# Altium footprint library CONN_HDR_1.27MM_ST.PcbLib: 116 footprints (part 8 of 9) (continued)
## HDRMINI_M_2X10 [mm] "mini header (50mil pitch)" (continued)
3D body: height 7.3, standoff -2.5, extent -3.375,-0.835 -2.975,-0.435
3D body: height 2.8, standoff 0, extent -2.54,0 -1.27,1.27
3D body: height 7.3, standoff -2.5, extent -2.105,0.435 -1.705,0.835
3D body: height 2.8, standoff 0, extent -3.81,0 -2.54,1.27
3D body: height 7.3, standoff -2.5, extent -3.375,0.435 -2.975,0.835
3D body: height 2.8, standoff 0, extent -5.08,-1.27 -3.81,0
3D body: height 7.3, standoff -2.5, extent -4.645,-0.835 -4.245,-0.435
3D body: height 2.8, standoff 0, extent -6.35,-1.27 -5.08,0
3D body: height 7.3, standoff -2.5, extent -5.915,-0.835 -5.515,-0.435
3D body: height 2.8, standoff 0, extent -5.08,0 -3.81,1.27
3D body: height 7.3, standoff -2.5, extent -4.645,0.435 -4.245,0.835
3D body: height 2.8, standoff 0, extent -6.35,0 -5.08,1.27
3D body: height 7.3, standoff -2.5, extent -5.915,0.435 -5.515,0.835

## HDRMINI_M_2X11 [mm] "mini header (50mil pitch)"
pads (22):
  round 1 hole 0.7 mask+0.05: 1(-6.35,-0.635) 2(-6.35,0.635) 3(-5.08,-0.635) 4(-5.08,0.635) 5(-3.81,-0.635) 6(-3.81,0.635) 7(-2.54,-0.635) 8(-2.54,0.635) 9(-1.27,-0.635) 10(-1.27,0.635) 11(0,-0.635) 12(0,0.635) 13(1.27,-0.635) 14(1.27,0.635) 15(2.54,-0.635) 16(2.54,0.635) 17(3.81,-0.635) 18(3.81,0.635) 19(5.08,-0.635) 20(5.08,0.635) 21(6.35,-0.635) 22(6.35,0.635)
Top Overlay:
  circle w0.2: c-7.493,-0.635 r0.2
  lines w0.2: -6.886,-0.035 -6.985,-0.2 -6.985,-1.27 -6.886,-1.435 -5.814,-1.435 -5.715,-1.27 -5.616,-1.435 -4.544,-1.435 -4.445,-1.27 -4.346,-1.435 -3.274,-1.435 -3.175,-1.27 -3.076,-1.435 -2.004,-1.435 -1.905,-1.27 -1.806,-1.435 -0.734,-1.435 -0.635,-1.27 -0.536,-1.435 0.536,-1.435 0.635,-1.27 0.734,-1.435 1.806,-1.435 1.905,-1.27 2.004,-1.435 3.076,-1.435 3.175,-1.27 3.274,-1.435 4.346,-1.435 4.445,-1.27 4.544,-1.435 5.616,-1.435 5.715,-1.27 5.814,-1.435 6.886,-1.435 6.985,-1.27 6.985,-0.2 6.886,-0.035 ; -6.886,0.035 -6.985,0.2 -6.985,1.27 -6.886,1.435 -5.814,1.435 -5.715,1.27 -5.616,1.435 -4.544,1.435 -4.445,1.27 -4.346,1.435 -3.274,1.435 -3.175,1.27 -3.076,1.435 -2.004,1.435 -1.905,1.27 -1.806,1.435 -0.734,1.435 -0.635,1.27 -0.536,1.435 0.536,1.435 0.635,1.27 0.734,1.435 1.806,1.435 1.905,1.27 2.004,1.435 3.076,1.435 3.175,1.27 3.274,1.435 4.346,1.435 4.445,1.27 4.544,1.435 5.616,1.435 5.715,1.27 5.814,1.435 6.886,1.435 6.985,1.27 6.985,0.2 6.886,0.035
3D body: height 7.3, standoff -2.5, extent -6.55,0.435 -6.15,0.835
3D body: height 2.8, standoff 0, extent -6.985,0 -5.715,1.27
3D body: height 7.3, standoff -2.5, extent -5.28,0.435 -4.88,0.835
3D body: height 2.8, standoff 0, extent -5.715,0 -4.445,1.27
3D body: height 7.3, standoff -2.5, extent -6.55,-0.835 -6.15,-0.435
3D body: height 2.8, standoff 0, extent -6.985,-1.27 -5.715,0
3D body: height 7.3, standoff -2.5, extent -5.28,-0.835 -4.88,-0.435
3D body: height 2.8, standoff 0, extent -5.715,-1.27 -4.445,0
3D body: height 7.3, standoff -2.5, extent -4.01,0.435 -3.61,0.835
3D body: height 2.8, standoff 0, extent -4.445,0 -3.175,1.27
3D body: height 7.3, standoff -2.5, extent -2.74,0.435 -2.34,0.835
3D body: height 2.8, standoff 0, extent -3.175,0 -1.905,1.27
3D body: height 7.3, standoff -2.5, extent -4.01,-0.835 -3.61,-0.435
3D body: height 2.8, standoff 0, extent -4.445,-1.27 -3.175,0
3D body: height 7.3, standoff -2.5, extent -2.74,-0.835 -2.34,-0.435
3D body: height 2.8, standoff 0, extent -3.175,-1.27 -1.905,0
3D body: height 7.3, standoff -2.5, extent -1.47,0.435 -1.07,0.835
3D body: height 2.8, standoff 0, extent -1.905,0 -0.635,1.27
3D body: height 7.3, standoff -2.5, extent -0.2,0.435 0.2,0.835
3D body: height 2.8, standoff 0, extent -0.635,0 0.635,1.27
3D body: height 7.3, standoff -2.5, extent -1.47,-0.835 -1.07,-0.435
3D body: height 2.8, standoff 0, extent -1.905,-1.27 -0.635,0
3D body: height 7.3, standoff -2.5, extent -0.2,-0.835 0.2,-0.435
3D body: height 2.8, standoff 0, extent -0.635,-1.27 0.635,0
3D body: height 7.3, standoff -2.5, extent 1.07,0.435 1.47,0.835
3D body: height 2.8, standoff 0, extent 0.635,0 1.905,1.27
3D body: height 7.3, standoff -2.5, extent 2.34,0.435 2.74,0.835
3D body: height 2.8, standoff 0, extent 1.905,0 3.175,1.27
3D body: height 7.3, standoff -2.5, extent 1.07,-0.835 1.47,-0.435
3D body: height 2.8, standoff 0, extent 0.635,-1.27 1.905,0
3D body: height 7.3, standoff -2.5, extent 2.34,-0.835 2.74,-0.435
3D body: height 2.8, standoff 0, extent 1.905,-1.27 3.175,0
3D body: height 7.3, standoff -2.5, extent 3.61,0.435 4.01,0.835
3D body: height 2.8, standoff 0, extent 3.175,0 4.445,1.27
3D body: height 7.3, standoff -2.5, extent 4.88,0.435 5.28,0.835
3D body: height 2.8, standoff 0, extent 4.445,0 5.715,1.27
3D body: height 7.3, standoff -2.5, extent 3.61,-0.835 4.01,-0.435
3D body: height 2.8, standoff 0, extent 3.175,-1.27 4.445,0
3D body: height 7.3, standoff -2.5, extent 4.88,-0.835 5.28,-0.435
3D body: height 2.8, standoff 0, extent 4.445,-1.27 5.715,0
3D body: height 7.3, standoff -2.5, extent 6.15,0.435 6.55,0.835
3D body: height 2.8, standoff 0, extent 5.715,0 6.985,1.27
3D body: height 7.3, standoff -2.5, extent 6.15,-0.835 6.55,-0.435
3D body: height 2.8, standoff 0, extent 5.715,-1.27 6.985,0

## HDRMINI_M_2X12 [mm] "mini header (50mil pitch)"
pads (24):
  round 1 hole 0.7 mask+0.05: 1(-6.985,-0.635) 2(-6.985,0.635) 3(-5.715,-0.635) 4(-5.715,0.635) 5(-4.445,-0.635) 6(-4.445,0.635) 7(-3.175,-0.635) 8(-3.175,0.635) 9(-1.905,-0.635) 10(-1.905,0.635) 11(-0.635,-0.635) 12(-0.635,0.635) 13(0.635,-0.635) 14(0.635,0.635) 15(1.905,-0.635) 16(1.905,0.635) 17(3.175,-0.635) 18(3.175,0.635) 19(4.445,-0.635) 20(4.445,0.635) 21(5.715,-0.635) 22(5.715,0.635) 23(6.985,-0.635) 24(6.985,0.635)
Top Overlay:
  circle w0.2: c-8.128,-0.635 r0.2
  lines w0.2: -7.521,-0.035 -7.62,-0.2 -7.62,-1.27 -7.521,-1.435 -6.449,-1.435 -6.35,-1.27 -6.251,-1.435 -5.179,-1.435 -5.08,-1.27 -4.981,-1.435 -3.909,-1.435 -3.81,-1.27 -3.711,-1.435 -2.639,-1.435 -2.54,-1.27 -2.441,-1.435 -1.369,-1.435 -1.27,-1.27 -1.171,-1.435 -0.099,-1.435 0,-1.27 0.099,-1.435 1.171,-1.435 1.27,-1.27 1.369,-1.435 2.441,-1.435 2.54,-1.27 2.639,-1.435 3.711,-1.435 3.81,-1.27 3.909,-1.435 4.981,-1.435 5.08,-1.27 5.179,-1.435 6.251,-1.435 6.35,-1.27 6.449,-1.435 7.521,-1.435 7.62,-1.27 7.62,-0.2 7.521,-0.035 ; -7.521,0.035 -7.62,0.2 -7.62,1.27 -7.521,1.435 -6.449,1.435 -6.35,1.27 -6.251,1.435 -5.179,1.435 -5.08,1.27 -4.981,1.435 -3.909,1.435 -3.81,1.27 -3.711,1.435 -2.639,1.435 -2.54,1.27 -2.441,1.435 -1.369,1.435 -1.27,1.27 -1.171,1.435 -0.099,1.435 0,1.27 0.099,1.435 1.171,1.435 1.27,1.27 1.369,1.435 2.441,1.435 2.54,1.27 2.639,1.435 3.711,1.435 3.81,1.27 3.909,1.435 4.981,1.435 5.08,1.27 5.179,1.435 6.251,1.435 6.35,1.27 6.449,1.435 7.521,1.435 7.62,1.27 7.62,0.2 7.521,0.035
3D body: height 2.8, standoff 0, extent 6.35,-1.27 7.62,0
3D body: height 7.3, standoff -2.5, extent 6.785,-0.835 7.185,-0.435
3D body: height 2.8, standoff 0, extent 5.08,-1.27 6.35,0
3D body: height 7.3, standoff -2.5, extent 5.515,-0.835 5.915,-0.435
3D body: height 2.8, standoff 0, extent 6.35,0 7.62,1.27
3D body: height 7.3, standoff -2.5, extent 6.785,0.435 7.185,0.835
3D body: height 2.8, standoff 0, extent 5.08,0 6.35,1.27
3D body: height 7.3, standoff -2.5, extent 5.515,0.435 5.915,0.835
3D body: height 2.8, standoff 0, extent 3.81,-1.27 5.08,0
3D body: height 7.3, standoff -2.5, extent 4.245,-0.835 4.645,-0.435
3D body: height 2.8, standoff 0, extent 2.54,-1.27 3.81,0
3D body: height 7.3, standoff -2.5, extent 2.975,-0.835 3.375,-0.435
3D body: height 2.8, standoff 0, extent 3.81,0 5.08,1.27
3D body: height 7.3, standoff -2.5, extent 4.245,0.435 4.645,0.835
3D body: height 2.8, standoff 0, extent 2.54,0 3.81,1.27
3D body: height 7.3, standoff -2.5, extent 2.975,0.435 3.375,0.835
3D body: height 2.8, standoff 0, extent 1.27,-1.27 2.54,0
3D body: height 7.3, standoff -2.5, extent 1.705,-0.835 2.105,-0.435
3D body: height 2.8, standoff 0, extent 0,-1.27 1.27,0
3D body: height 7.3, standoff -2.5, extent 0.435,-0.835 0.835,-0.435
3D body: height 2.8, standoff 0, extent 1.27,0 2.54,1.27
3D body: height 7.3, standoff -2.5, extent 1.705,0.435 2.105,0.835
3D body: height 2.8, standoff 0, extent 0,0 1.27,1.27
3D body: height 7.3, standoff -2.5, extent 0.435,0.435 0.835,0.835
3D body: height 2.8, standoff 0, extent -1.27,-1.27 0,0
3D body: height 7.3, standoff -2.5, extent -0.835,-0.835 -0.435,-0.435
3D body: height 2.8, standoff 0, extent -2.54,-1.27 -1.27,0
3D body: height 7.3, standoff -2.5, extent -2.105,-0.835 -1.705,-0.435
3D body: height 2.8, standoff 0, extent -1.27,0 0,1.27
3D body: height 7.3, standoff -2.5, extent -0.835,0.435 -0.435,0.835
3D body: height 2.8, standoff 0, extent -2.54,0 -1.27,1.27
3D body: height 7.3, standoff -2.5, extent -2.105,0.435 -1.705,0.835
3D body: height 2.8, standoff 0, extent -3.81,-1.27 -2.54,0
3D body: height 7.3, standoff -2.5, extent -3.375,-0.835 -2.975,-0.435
3D body: height 2.8, standoff 0, extent -5.08,-1.27 -3.81,0
3D body: height 7.3, standoff -2.5, extent -4.645,-0.835 -4.245,-0.435
3D body: height 2.8, standoff 0, extent -3.81,0 -2.54,1.27
3D body: height 7.3, standoff -2.5, extent -3.375,0.435 -2.975,0.835
3D body: height 2.8, standoff 0, extent -5.08,0 -3.81,1.27
3D body: height 7.3, standoff -2.5, extent -4.645,0.435 -4.245,0.835
3D body: height 2.8, standoff 0, extent -6.35,-1.27 -5.08,0
3D body: height 7.3, standoff -2.5, extent -5.915,-0.835 -5.515,-0.435
3D body: height 2.8, standoff 0, extent -7.62,-1.27 -6.35,0
3D body: height 7.3, standoff -2.5, extent -7.185,-0.835 -6.785,-0.435
3D body: height 2.8, standoff 0, extent -6.35,0 -5.08,1.27
3D body: height 7.3, standoff -2.5, extent -5.915,0.435 -5.515,0.835
3D body: height 2.8, standoff 0, extent -7.62,0 -6.35,1.27
3D body: height 7.3, standoff -2.5, extent -7.185,0.435 -6.785,0.835

## HDRMINI_M_2X13 [mm] "mini header (50mil pitch)"
pads (26):
  round 1 hole 0.7 mask+0.05: 1(-7.62,-0.635) 2(-7.62,0.635) 3(-6.35,-0.635) 4(-6.35,0.635) 5(-5.08,-0.635) 6(-5.08,0.635) 7(-3.81,-0.635) 8(-3.81,0.635) 9(-2.54,-0.635) 10(-2.54,0.635) 11(-1.27,-0.635) 12(-1.27,0.635) 13(0,-0.635) 14(0,0.635) 15(1.27,-0.635) 16(1.27,0.635) 17(2.54,-0.635) 18(2.54,0.635) 19(3.81,-0.635) 20(3.81,0.635) 21(5.08,-0.635) 22(5.08,0.635) 23(6.35,-0.635) 24(6.35,0.635) 25(7.62,-0.635) 26(7.62,0.635)
Top Overlay:
  circle w0.2: c-8.763,-0.635 r0.2
  lines w0.2: -8.156,-0.035 -8.255,-0.2 -8.255,-1.27 -8.156,-1.435 -7.084,-1.435 -6.985,-1.27 -6.886,-1.435 -5.814,-1.435 -5.715,-1.27 -5.616,-1.435 -4.544,-1.435 -4.445,-1.27 -4.346,-1.435 -3.274,-1.435 -3.175,-1.27 -3.076,-1.435 -2.004,-1.435 -1.905,-1.27 -1.806,-1.435 -0.734,-1.435 -0.635,-1.27 -0.536,-1.435 0.536,-1.435 0.635,-1.27 0.734,-1.435 1.806,-1.435 1.905,-1.27 2.004,-1.435 3.076,-1.435 3.175,-1.27 3.274,-1.435 4.346,-1.435 4.445,-1.27 4.544,-1.435 5.616,-1.435 5.715,-1.27 5.814,-1.435 6.886,-1.435 6.985,-1.27 7.084,-1.435 8.156,-1.435 8.255,-1.27 8.255,-0.2 8.156,-0.035 ; -8.156,0.035 -8.255,0.2 -8.255,1.27 -8.156,1.435 -7.084,1.435 -6.985,1.27 -6.886,1.435 -5.814,1.435 -5.715,1.27 -5.616,1.435 -4.544,1.435 -4.445,1.27 -4.346,1.435 -3.274,1.435 -3.175,1.27 -3.076,1.435 -2.004,1.435 -1.905,1.27 -1.806,1.435 -0.734,1.435 -0.635,1.27 -0.536,1.435 0.536,1.435 0.635,1.27 0.734,1.435 1.806,1.435 1.905,1.27 2.004,1.435 3.076,1.435 3.175,1.27 3.274,1.435 4.346,1.435 4.445,1.27 4.544,1.435 5.616,1.435 5.715,1.27 5.814,1.435 6.886,1.435 6.985,1.27 7.084,1.435 8.156,1.435 8.255,1.27 8.255,0.2 8.156,0.035
3D body: height 7.3, standoff -2.5, extent -7.82,0.435 -7.42,0.835
3D body: height 2.8, standoff 0, extent -8.255,0 -6.985,1.27
3D body: height 7.3, standoff -2.5, extent -6.55,0.435 -6.15,0.835
3D body: height 2.8, standoff 0, extent -6.985,0 -5.715,1.27
3D body: height 7.3, standoff -2.5, extent -7.82,-0.835 -7.42,-0.435
3D body: height 2.8, standoff 0, extent -8.255,-1.27 -6.985,0
3D body: height 7.3, standoff -2.5, extent -6.55,-0.835 -6.15,-0.435
3D body: height 2.8, standoff 0, extent -6.985,-1.27 -5.715,0
3D body: height 7.3, standoff -2.5, extent -5.28,0.435 -4.88,0.835
3D body: height 2.8, standoff 0, extent -5.715,0 -4.445,1.27
3D body: height 7.3, standoff -2.5, extent -4.01,0.435 -3.61,0.835
3D body: height 2.8, standoff 0, extent -4.445,0 -3.175,1.27
3D body: height 7.3, standoff -2.5, extent -5.28,-0.835 -4.88,-0.435
3D body: height 2.8, standoff 0, extent -5.715,-1.27 -4.445,0
3D body: height 7.3, standoff -2.5, extent -4.01,-0.835 -3.61,-0.435
3D body: height 2.8, standoff 0, extent -4.445,-1.27 -3.175,0
3D body: height 7.3, standoff -2.5, extent -2.74,0.435 -2.34,0.835
3D body: height 2.8, standoff 0, extent -3.175,0 -1.905,1.27
3D body: height 7.3, standoff -2.5, extent -1.47,0.435 -1.07,0.835
3D body: height 2.8, standoff 0, extent -1.905,0 -0.635,1.27
3D body: height 7.3, standoff -2.5, extent -2.74,-0.835 -2.34,-0.435
3D body: height 2.8, standoff 0, extent -3.175,-1.27 -1.905,0
3D body: height 7.3, standoff -2.5, extent -1.47,-0.835 -1.07,-0.435
3D body: height 2.8, standoff 0, extent -1.905,-1.27 -0.635,0
3D body: height 7.3, standoff -2.5, extent -0.2,0.435 0.2,0.835
3D body: height 2.8, standoff 0, extent -0.635,0 0.635,1.27
3D body: height 7.3, standoff -2.5, extent 1.07,0.435 1.47,0.835
3D body: height 2.8, standoff 0, extent 0.635,0 1.905,1.27
3D body: height 7.3, standoff -2.5, extent -0.2,-0.835 0.2,-0.435
3D body: height 2.8, standoff 0, extent -0.635,-1.27 0.635,0
3D body: height 7.3, standoff -2.5, extent 1.07,-0.835 1.47,-0.435
3D body: height 2.8, standoff 0, extent 0.635,-1.27 1.905,0
3D body: height 7.3, standoff -2.5, extent 2.34,0.435 2.74,0.835
3D body: height 2.8, standoff 0, extent 1.905,0 3.175,1.27
3D body: height 7.3, standoff -2.5, extent 3.61,0.435 4.01,0.835
3D body: height 2.8, standoff 0, extent 3.175,0 4.445,1.27
3D body: height 7.3, standoff -2.5, extent 2.34,-0.835 2.74,-0.435
3D body: height 2.8, standoff 0, extent 1.905,-1.27 3.175,0
3D body: height 7.3, standoff -2.5, extent 3.61,-0.835 4.01,-0.435
3D body: height 2.8, standoff 0, extent 3.175,-1.27 4.445,0
3D body: height 7.3, standoff -2.5, extent 4.88,0.435 5.28,0.835
3D body: height 2.8, standoff 0, extent 4.445,0 5.715,1.27
3D body: height 7.3, standoff -2.5, extent 6.15,0.435 6.55,0.835
3D body: height 2.8, standoff 0, extent 5.715,0 6.985,1.27
3D body: height 7.3, standoff -2.5, extent 4.88,-0.835 5.28,-0.435
3D body: height 2.8, standoff 0, extent 4.445,-1.27 5.715,0
3D body: height 7.3, standoff -2.5, extent 6.15,-0.835 6.55,-0.435
3D body: height 2.8, standoff 0, extent 5.715,-1.27 6.985,0
3D body: height 7.3, standoff -2.5, extent 7.42,0.435 7.82,0.835
3D body: height 2.8, standoff 0, extent 6.985,0 8.255,1.27
3D body: height 7.3, standoff -2.5, extent 7.42,-0.835 7.82,-0.435
3D body: height 2.8, standoff 0, extent 6.985,-1.27 8.255,0

## HDRMINI_M_2X14 [mm] "mini header (50mil pitch)"
pads (28):
  round 1 hole 0.7 mask+0.05: 1(-8.255,-0.635) 2(-8.255,0.635) 3(-6.985,-0.635) 4(-6.985,0.635) 5(-5.715,-0.635) 6(-5.715,0.635) 7(-4.445,-0.635) 8(-4.445,0.635) 9(-3.175,-0.635) 10(-3.175,0.635) 11(-1.905,-0.635) 12(-1.905,0.635) 13(-0.635,-0.635) 14(-0.635,0.635) 15(0.635,-0.635) 16(0.635,0.635) 17(1.905,-0.635) 18(1.905,0.635) 19(3.175,-0.635) 20(3.175,0.635) 21(4.445,-0.635) 22(4.445,0.635) 23(5.715,-0.635) 24(5.715,0.635) 25(6.985,-0.635) 26(6.985,0.635) 27(8.255,-0.635) 28(8.255,0.635)
Top Overlay:
  circle w0.2: c-9.398,-0.635 r0.2
  lines w0.2: -8.791,-0.035 -8.89,-0.2 -8.89,-1.27 -8.791,-1.435 -7.719,-1.435 -7.62,-1.27 -7.521,-1.435 -6.449,-1.435 -6.35,-1.27 -6.251,-1.435 -5.179,-1.435 -5.08,-1.27 -4.981,-1.435 -3.909,-1.435 -3.81,-1.27 -3.711,-1.435 -2.639,-1.435 -2.54,-1.27 -2.441,-1.435 -1.369,-1.435 -1.27,-1.27 -1.171,-1.435 -0.099,-1.435 0,-1.27 0.099,-1.435 1.171,-1.435 1.27,-1.27 1.369,-1.435 2.441,-1.435 2.54,-1.27 2.639,-1.435 3.711,-1.435 3.81,-1.27 3.909,-1.435 4.981,-1.435 5.08,-1.27 5.179,-1.435 6.251,-1.435 6.35,-1.27 6.449,-1.435 7.521,-1.435 7.62,-1.27 7.719,-1.435 8.791,-1.435 8.89,-1.27 8.89,-0.2 8.791,-0.035 ; -8.791,0.035 -8.89,0.2 -8.89,1.27 -8.791,1.435 -7.719,1.435 -7.62,1.27 -7.521,1.435 -6.449,1.435 -6.35,1.27 -6.251,1.435 -5.179,1.435 -5.08,1.27 -4.981,1.435 -3.909,1.435 -3.81,1.27 -3.711,1.435 -2.639,1.435 -2.54,1.27 -2.441,1.435 -1.369,1.435 -1.27,1.27 -1.171,1.435 -0.099,1.435 0,1.27 0.099,1.435 1.171,1.435 1.27,1.27 1.369,1.435 2.441,1.435 2.54,1.27 2.639,1.435 3.711,1.435 3.81,1.27 3.909,1.435 4.981,1.435 5.08,1.27 5.179,1.435 6.251,1.435 6.35,1.27 6.449,1.435 7.521,1.435 7.62,1.27 7.719,1.435 8.791,1.435 8.89,1.27 8.89,0.2 8.791,0.035
3D body: height 2.8, standoff 0, extent 7.62,-1.27 8.89,0
3D body: height 7.3, standoff -2.5, extent 8.055,-0.835 8.455,-0.435
3D body: height 2.8, standoff 0, extent 6.35,-1.27 7.62,0
3D body: height 7.3, standoff -2.5, extent 6.785,-0.835 7.185,-0.435
3D body: height 2.8, standoff 0, extent 7.62,0 8.89,1.27
3D body: height 7.3, standoff -2.5, extent 8.055,0.435 8.455,0.835
3D body: height 2.8, standoff 0, extent 6.35,0 7.62,1.27
3D body: height 7.3, standoff -2.5, extent 6.785,0.435 7.185,0.835
3D body: height 2.8, standoff 0, extent 5.08,-1.27 6.35,0
3D body: height 7.3, standoff -2.5, extent 5.515,-0.835 5.915,-0.435
3D body: height 2.8, standoff 0, extent 3.81,-1.27 5.08,0
3D body: height 7.3, standoff -2.5, extent 4.245,-0.835 4.645,-0.435
3D body: height 2.8, standoff 0, extent 5.08,0 6.35,1.27
3D body: height 7.3, standoff -2.5, extent 5.515,0.435 5.915,0.835
3D body: height 2.8, standoff 0, extent 3.81,0 5.08,1.27
3D body: height 7.3, standoff -2.5, extent 4.245,0.435 4.645,0.835
3D body: height 2.8, standoff 0, extent 2.54,-1.27 3.81,0
3D body: height 7.3, standoff -2.5, extent 2.975,-0.835 3.375,-0.435
3D body: height 2.8, standoff 0, extent 1.27,-1.27 2.54,0
3D body: height 7.3, standoff -2.5, extent 1.705,-0.835 2.105,-0.435
3D body: height 2.8, standoff 0, extent 2.54,0 3.81,1.27
3D body: height 7.3, standoff -2.5, extent 2.975,0.435 3.375,0.835
3D body: height 2.8, standoff 0, extent 1.27,0 2.54,1.27
3D body: height 7.3, standoff -2.5, extent 1.705,0.435 2.105,0.835
3D body: height 2.8, standoff 0, extent 0,-1.27 1.27,0
3D body: height 7.3, standoff -2.5, extent 0.435,-0.835 0.835,-0.435
3D body: height 2.8, standoff 0, extent -1.27,-1.27 0,0
3D body: height 7.3, standoff -2.5, extent -0.835,-0.835 -0.435,-0.435
3D body: height 2.8, standoff 0, extent 0,0 1.27,1.27
3D body: height 7.3, standoff -2.5, extent 0.435,0.435 0.835,0.835
3D body: height 2.8, standoff 0, extent -1.27,0 0,1.27
3D body: height 7.3, standoff -2.5, extent -0.835,0.435 -0.435,0.835
3D body: height 2.8, standoff 0, extent -2.54,-1.27 -1.27,0
3D body: height 7.3, standoff -2.5, extent -2.105,-0.835 -1.705,-0.435
3D body: height 2.8, standoff 0, extent -3.81,-1.27 -2.54,0
3D body: height 7.3, standoff -2.5, extent -3.375,-0.835 -2.975,-0.435
3D body: height 2.8, standoff 0, extent -2.54,0 -1.27,1.27
3D body: height 7.3, standoff -2.5, extent -2.105,0.435 -1.705,0.835
3D body: height 2.8, standoff 0, extent -3.81,0 -2.54,1.27
3D body: height 7.3, standoff -2.5, extent -3.375,0.435 -2.975,0.835
3D body: height 2.8, standoff 0, extent -5.08,-1.27 -3.81,0
3D body: height 7.3, standoff -2.5, extent -4.645,-0.835 -4.245,-0.435
3D body: height 2.8, standoff 0, extent -6.35,-1.27 -5.08,0
3D body: height 7.3, standoff -2.5, extent -5.915,-0.835 -5.515,-0.435
3D body: height 2.8, standoff 0, extent -5.08,0 -3.81,1.27
3D body: height 7.3, standoff -2.5, extent -4.645,0.435 -4.245,0.835
3D body: height 2.8, standoff 0, extent -6.35,0 -5.08,1.27
3D body: height 7.3, standoff -2.5, extent -5.915,0.435 -5.515,0.835
3D body: height 2.8, standoff 0, extent -7.62,-1.27 -6.35,0
3D body: height 7.3, standoff -2.5, extent -7.185,-0.835 -6.785,-0.435
3D body: height 2.8, standoff 0, extent -8.89,-1.27 -7.62,0
3D body: height 7.3, standoff -2.5, extent -8.455,-0.835 -8.055,-0.435
3D body: height 2.8, standoff 0, extent -7.62,0 -6.35,1.27
3D body: height 7.3, standoff -2.5, extent -7.185,0.435 -6.785,0.835
3D body: height 2.8, standoff 0, extent -8.89,0 -7.62,1.27
3D body: height 7.3, standoff -2.5, extent -8.455,0.435 -8.055,0.835

## HDRMINI_M_2X15 [mm] "mini header (50mil pitch)"
pads (30):
  round 1 hole 0.7 mask+0.05: 1(-8.89,-0.635) 2(-8.89,0.635) 3(-7.62,-0.635) 4(-7.62,0.635) 5(-6.35,-0.635) 6(-6.35,0.635) 7(-5.08,-0.635) 8(-5.08,0.635) 9(-3.81,-0.635) 10(-3.81,0.635) 11(-2.54,-0.635) 12(-2.54,0.635) 13(-1.27,-0.635) 14(-1.27,0.635) 15(0,-0.635) 16(0,0.635) 17(1.27,-0.635) 18(1.27,0.635) 19(2.54,-0.635) 20(2.54,0.635) 21(3.81,-0.635) 22(3.81,0.635) 23(5.08,-0.635) 24(5.08,0.635) 25(6.35,-0.635) 26(6.35,0.635) 27(7.62,-0.635) 28(7.62,0.635) 29(8.89,-0.635) 30(8.89,0.635)
Top Overlay:
  circle w0.2: c-10.033,-0.635 r0.2
  lines w0.2: -9.426,-0.035 -9.525,-0.2 -9.525,-1.27 -9.426,-1.435 -8.354,-1.435 -8.255,-1.27 -8.156,-1.435 -7.084,-1.435 -6.985,-1.27 -6.886,-1.435 -5.814,-1.435 -5.715,-1.27 -5.616,-1.435 -4.544,-1.435 -4.445,-1.27 -4.346,-1.435 -3.274,-1.435 -3.175,-1.27 -3.076,-1.435 -2.004,-1.435 -1.905,-1.27 -1.806,-1.435 -0.734,-1.435 -0.635,-1.27 -0.536,-1.435 0.536,-1.435 0.635,-1.27 0.734,-1.435 1.806,-1.435 1.905,-1.27 2.004,-1.435 3.076,-1.435 3.175,-1.27 3.274,-1.435 4.346,-1.435 4.445,-1.27 4.544,-1.435 5.616,-1.435 5.715,-1.27 5.814,-1.435 6.886,-1.435 6.985,-1.27 7.084,-1.435 8.156,-1.435 8.255,-1.27 8.354,-1.435 9.426,-1.435 9.525,-1.27 9.525,-0.2 9.426,-0.035 ; -9.426,0.035 -9.525,0.2 -9.525,1.27 -9.426,1.435 -8.354,1.435 -8.255,1.27 -8.156,1.435 -7.084,1.435 -6.985,1.27 -6.886,1.435 -5.814,1.435 -5.715,1.27 -5.616,1.435 -4.544,1.435 -4.445,1.27 -4.346,1.435 -3.274,1.435 -3.175,1.27 -3.076,1.435 -2.004,1.435 -1.905,1.27 -1.806,1.435 -0.734,1.435 -0.635,1.27 -0.536,1.435 0.536,1.435 0.635,1.27 0.734,1.435 1.806,1.435 1.905,1.27 2.004,1.435 3.076,1.435 3.175,1.27 3.274,1.435 4.346,1.435 4.445,1.27 4.544,1.435 5.616,1.435 5.715,1.27 5.814,1.435 6.886,1.435 6.985,1.27 7.084,1.435 8.156,1.435 8.255,1.27 8.354,1.435 9.426,1.435 9.525,1.27 9.525,0.2 9.426,0.035
3D body: height 2.8, standoff 0, extent 8.255,-1.27 9.525,0
3D body: height 7.3, standoff -2.5, extent 8.69,-0.835 9.09,-0.435
3D body: height 2.8, standoff 0, extent 8.255,0 9.525,1.27
3D body: height 7.3, standoff -2.5, extent 8.69,0.435 9.09,0.835
3D body: height 2.8, standoff 0, extent 6.985,-1.27 8.255,0
3D body: height 7.3, standoff -2.5, extent 7.42,-0.835 7.82,-0.435
3D body: height 2.8, standoff 0, extent 5.715,-1.27 6.985,0
3D body: height 7.3, standoff -2.5, extent 6.15,-0.835 6.55,-0.435
3D body: height 2.8, standoff 0, extent 6.985,0 8.255,1.27
3D body: height 7.3, standoff -2.5, extent 7.42,0.435 7.82,0.835
3D body: height 2.8, standoff 0, extent 5.715,0 6.985,1.27
3D body: height 7.3, standoff -2.5, extent 6.15,0.435 6.55,0.835
3D body: height 2.8, standoff 0, extent 4.445,-1.27 5.715,0
3D body: height 7.3, standoff -2.5, extent 4.88,-0.835 5.28,-0.435
3D body: height 2.8, standoff 0, extent 3.175,-1.27 4.445,0
3D body: height 7.3, standoff -2.5, extent 3.61,-0.835 4.01,-0.435
3D body: height 2.8, standoff 0, extent 4.445,0 5.715,1.27
3D body: height 7.3, standoff -2.5, extent 4.88,0.435 5.28,0.835
3D body: height 2.8, standoff 0, extent 3.175,0 4.445,1.27
3D body: height 7.3, standoff -2.5, extent 3.61,0.435 4.01,0.835
3D body: height 2.8, standoff 0, extent 1.905,-1.27 3.175,0
3D body: height 7.3, standoff -2.5, extent 2.34,-0.835 2.74,-0.435
3D body: height 2.8, standoff 0, extent 0.635,-1.27 1.905,0
3D body: height 7.3, standoff -2.5, extent 1.07,-0.835 1.47,-0.435
3D body: height 2.8, standoff 0, extent 1.905,0 3.175,1.27
3D body: height 7.3, standoff -2.5, extent 2.34,0.435 2.74,0.835
3D body: height 2.8, standoff 0, extent 0.635,0 1.905,1.27
3D body: height 7.3, standoff -2.5, extent 1.07,0.435 1.47,0.835
3D body: height 2.8, standoff 0, extent -0.635,-1.27 0.635,0
3D body: height 7.3, standoff -2.5, extent -0.2,-0.835 0.2,-0.435
3D body: height 2.8, standoff 0, extent -1.905,-1.27 -0.635,0
3D body: height 7.3, standoff -2.5, extent -1.47,-0.835 -1.07,-0.435
3D body: height 2.8, standoff 0, extent -0.635,0 0.635,1.27
3D body: height 7.3, standoff -2.5, extent -0.2,0.435 0.2,0.835
3D body: height 2.8, standoff 0, extent -1.905,0 -0.635,1.27
3D body: height 7.3, standoff -2.5, extent -1.47,0.435 -1.07,0.835
3D body: height 2.8, standoff 0, extent -3.175,-1.27 -1.905,0
3D body: height 7.3, standoff -2.5, extent -2.74,-0.835 -2.34,-0.435
3D body: height 2.8, standoff 0, extent -4.445,-1.27 -3.175,0
3D body: height 7.3, standoff -2.5, extent -4.01,-0.835 -3.61,-0.435
3D body: height 2.8, standoff 0, extent -3.175,0 -1.905,1.27
3D body: height 7.3, standoff -2.5, extent -2.74,0.435 -2.34,0.835
3D body: height 2.8, standoff 0, extent -4.445,0 -3.175,1.27
3D body: height 7.3, standoff -2.5, extent -4.01,0.435 -3.61,0.835
3D body: height 2.8, standoff 0, extent -5.715,-1.27 -4.445,0
3D body: height 7.3, standoff -2.5, extent -5.28,-0.835 -4.88,-0.435
3D body: height 2.8, standoff 0, extent -6.985,-1.27 -5.715,0
3D body: height 7.3, standoff -2.5, extent -6.55,-0.835 -6.15,-0.435
3D body: height 2.8, standoff 0, extent -5.715,0 -4.445,1.27
3D body: height 7.3, standoff -2.5, extent -5.28,0.435 -4.88,0.835
3D body: height 2.8, standoff 0, extent -6.985,0 -5.715,1.27
3D body: height 7.3, standoff -2.5, extent -6.55,0.435 -6.15,0.835
3D body: height 2.8, standoff 0, extent -8.255,-1.27 -6.985,0
3D body: height 7.3, standoff -2.5, extent -7.82,-0.835 -7.42,-0.435
3D body: height 2.8, standoff 0, extent -9.525,-1.27 -8.255,0
3D body: height 7.3, standoff -2.5, extent -9.09,-0.835 -8.69,-0.435
3D body: height 2.8, standoff 0, extent -8.255,0 -6.985,1.27
3D body: height 7.3, standoff -2.5, extent -7.82,0.435 -7.42,0.835
3D body: height 2.8, standoff 0, extent -9.525,0 -8.255,1.27
3D body: height 7.3, standoff -2.5, extent -9.09,0.435 -8.69,0.835